# Altium footprint library 5-C-THD.PcbLib: 166 footprints (part 10 of 11)
Each footprint in its own frame and in the unit in brackets; x right, y up, seen from the top. Pads: shape width x height; smd on the part's side, far side on the other; paste and mask are expansions set on the pad; w line width, h text height; cw(c..) or ccw(c..) is an arc to the next point about the centre after c.
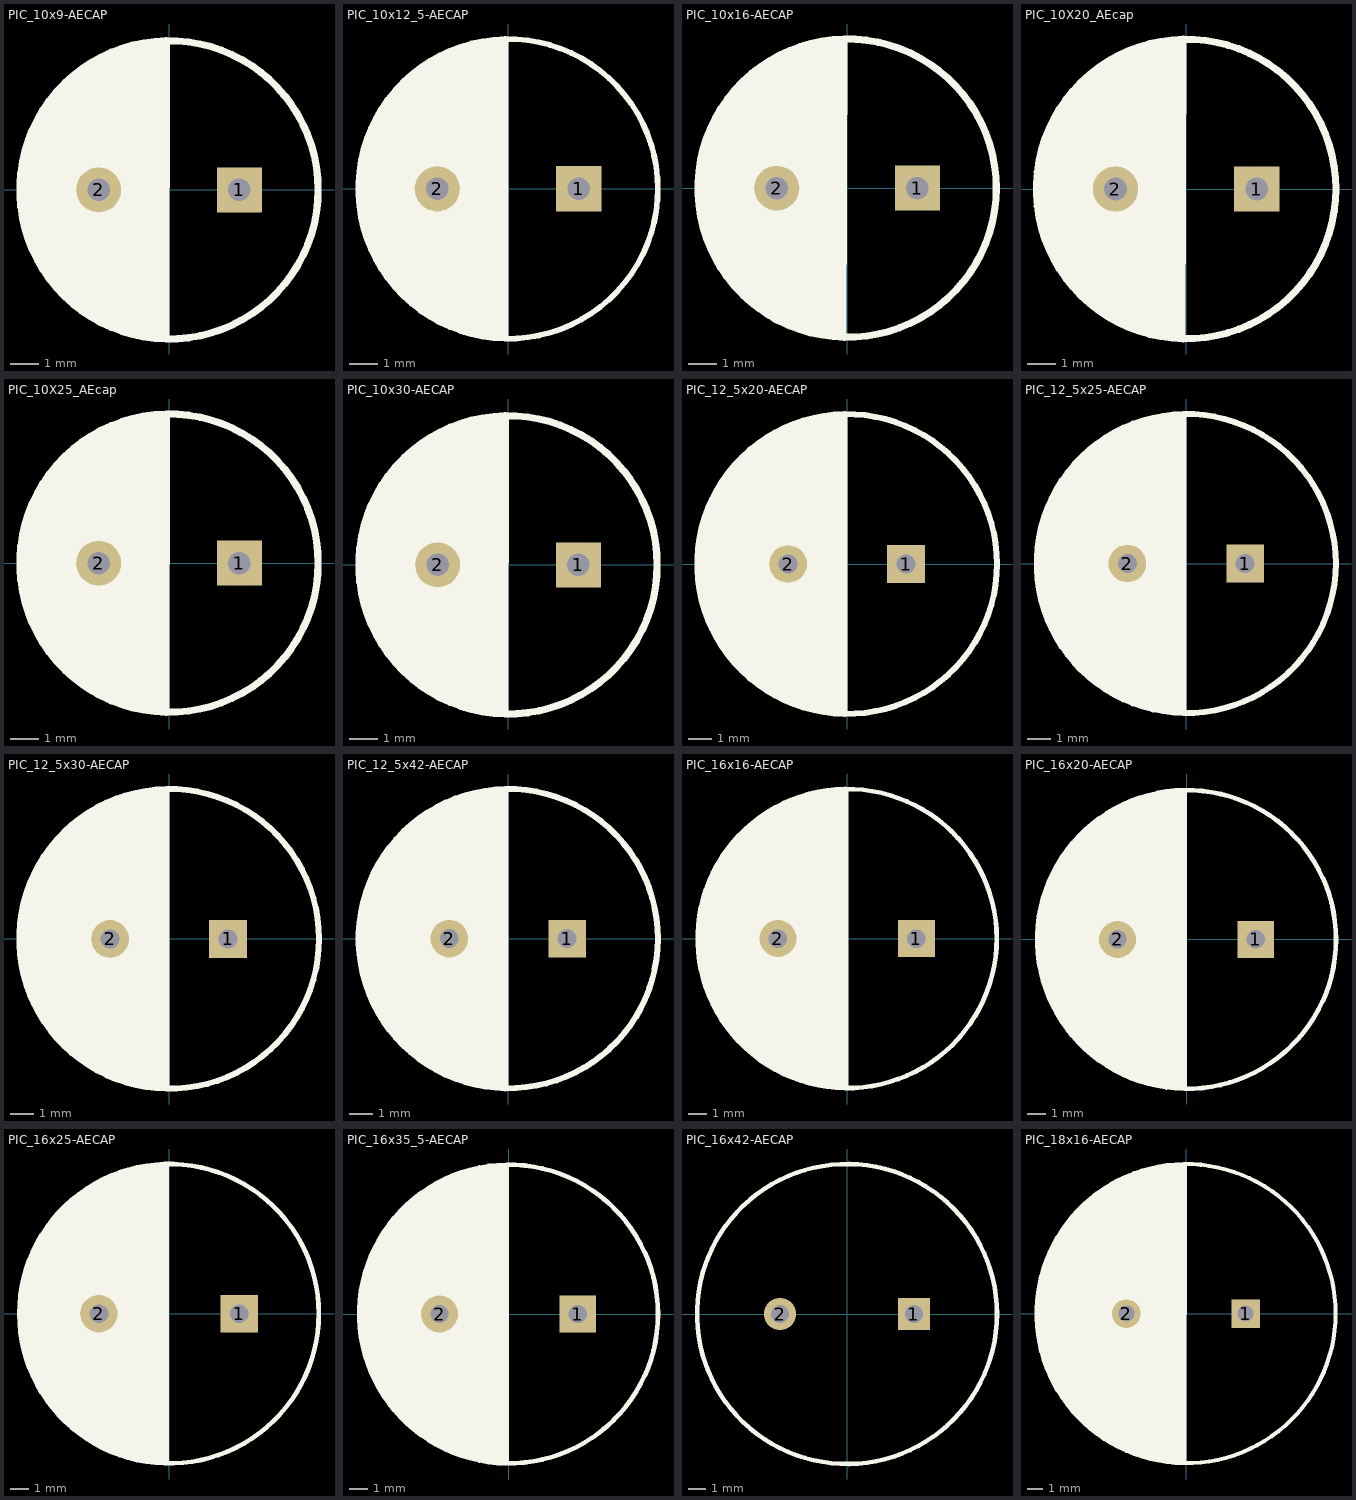
[diagram p9: the footprints below, top view; thin cyan lines are the x and y axes]

## PIC_10x9-AECAP [mm]
height 45
pads (2):
  rect 1.6x1.6 hole 0.8 mask+0.051: 1(2.5,0)
  round 1.6 hole 0.8 mask+0.051: 2(-2.5,0)
Top Overlay:
  circle w0.254: c0,0 r5.3
  region: 0,-5.258 -1.575,-5.08 -2.565,-4.674 -3.607,-3.886 -4.369,-3.073 -5.004,-1.803 -5.283,-0.432 -5.258,0.787 -4.978,1.803 -4.343,3.124 -3.531,3.962 -2.616,4.623 -1.676,5.055 -0.584,5.334 0.025,5.359
3D body "pic_10x9-aecap.stp": height 9, standoff -2.26, extent -5.01,-5.01 5,4.99
3D body "1_6-1_6-0_6-1_8.stp": height -0.95, standoff -2.75, extent -3.3,-0.81 -1.7,0.79
3D body "1_6-1_6-0_6-1_8.stp": height -0.95, standoff -2.75, extent 1.74,-0.81 3.34,0.79

## PIC_10x12_5-AECAP [mm]
height 45
pads (2):
  rect 1.6x1.6 hole 0.8 mask+0.051: 1(2.5,0)
  round 1.6 hole 0.8 mask+0.051: 2(-2.5,0)
Top Overlay:
  circle w0.2: c0,0 r5.3
  region: 0,-5.29 0,5.25 0.03,5.28 -1.07,5.22 -2.1,4.88 -2.99,4.35 -3.99,3.61 -4.61,2.65 -5.05,1.67 -5.26,0.69 -5.29,-0.86 -4.85,-2.27 -3.97,-3.51 -2.85,-4.5 -1.84,-4.99 -0.6,-5.28 -0.04,-5.31
3D body "pic_10x12_5-aecap.stp": height 12.5, standoff -2.25, extent -5.003,-5.01 5,4.99

## PIC_10x16-AECAP [mm]
height 45
pads (2):
  rect 1.6x1.6 hole 0.8 mask+0.051: 1(2.5,0)
  round 1.6 hole 0.8 mask+0.051: 2(-2.5,0)
Top Overlay:
  circle w0.254: c0,0 r5.3
  region: -0.025,-5.359 -1.6,-5.182 -2.591,-4.775 -3.632,-3.988 -4.394,-3.175 -5.029,-1.905 -5.309,-0.533 -5.283,0.686 -5.004,1.702 -4.369,3.023 -3.556,3.861 -2.642,4.521 -1.702,4.953 -0.61,5.232 0,5.258
3D body "pic_10x16-accap.stp": height 16, standoff -2.25, extent -4.973,-5.02 5.03,4.98

## PIC_10X20_AEcap [mm]
height 45
pads (2):
  rect 1.6x1.6 hole 0.8 mask+0.051: 1(2.5,0)
  round 1.6 hole 0.8 mask+0.051: 2(-2.5,0)
Top Overlay:
  circle w0.254: c0,0 r5.3
  region: -0.025,-5.309 -1.6,-5.131 -2.591,-4.724 -3.632,-3.937 -4.394,-3.124 -5.029,-1.854 -5.309,-0.483 -5.283,0.737 -5.004,1.753 -4.369,3.073 -3.556,3.912 -2.642,4.572 -1.702,5.004 -0.61,5.283 0,5.309
3D body "pic_10x16-accap.stp": height 16, standoff -2.25, extent -4.993,-4.99 5.01,5.01

## PIC_10X25_AEcap [mm]
height 45
pads (2):
  rect 1.6x1.6 hole 0.8 mask+0.051: 1(2.5,0)
  round 1.6 hole 0.8 mask+0.051: 2(-2.5,0)
Top Overlay:
  circle w0.254: c0,0 r5.3
  region: 0,-5.359 -1.575,-5.182 -2.565,-4.775 -3.607,-3.988 -4.369,-3.175 -5.004,-1.905 -5.283,-0.533 -5.258,0.686 -4.978,1.702 -4.343,3.023 -3.531,3.861 -2.616,4.521 -1.676,4.953 -0.584,5.232 0.025,5.258
3D body "pic_10x25-aecap.stp": height 25, standoff -2.37, extent -5.01,-5.01 5,4.99

## PIC_10x30-AECAP [mm]
height 45
pads (2):
  rect 1.6x1.6 hole 0.8 mask+0.051: 1(2.5,0)
  round 1.6 hole 0.8 mask+0.051: 2(-2.5,0)
Top Overlay:
  circle w0.254: c0,0 r5.3
  region: 0,-5.258 -1.575,-5.08 -2.565,-4.674 -3.607,-3.886 -4.369,-3.073 -5.004,-1.803 -5.283,-0.432 -5.258,0.787 -4.978,1.803 -4.343,3.124 -3.531,3.962 -2.616,4.623 -1.676,5.055 -0.584,5.334 0.025,5.359
3D body "pic_10x30-aecap.stp": height 30, standoff -2.18, extent -5,-5.01 5.01,4.99

## PIC_12_5x20-AECAP [mm]
height 45
pads (2):
  rect 1.6x1.6 hole 0.8 mask+0.051: 1(2.5,0)
  round 1.6 hole 0.8 mask+0.051: 2(-2.5,0)
Top Overlay:
  circle w0.254: c0,0 r6.35
  region: 0.01,-6.34 0.01,6.31 -0.03,6.31 -1.52,6.18 -2.8,5.72 -4.18,4.75 -5.09,3.75 -5.78,2.7 -6.18,1.44 -6.36,-0.15 -6.16,-1.48 -5.78,-2.67 -5.13,-3.74 -4.16,-4.88 -2.94,-5.65 -1.69,-6.13 -0.36,-6.34
3D body "PIC_12_5x20-AECAP.stp": height 20, standoff -2.21, extent -6.261,-6.24 6.25,6.26

## PIC_12_5x25-AECAP [mm]
height 45
pads (2):
  rect 1.6x1.6 hole 0.8 mask+0.051: 1(2.5,0)
  round 1.6 hole 0.8 mask+0.051: 2(-2.5,0)
Top Overlay:
  circle w0.254: c0,0 r6.35
  region: 0,-6.39 0,6.26 -0.04,6.26 -1.53,6.13 -2.81,5.67 -4.19,4.7 -5.1,3.7 -5.79,2.65 -6.19,1.39 -6.37,-0.2 -6.17,-1.53 -5.79,-2.72 -5.14,-3.79 -4.17,-4.93 -2.95,-5.7 -1.7,-6.18 -0.37,-6.39
3D body "pic_10x25-aecap.stp": height 25, standoff -2.37, extent -5.01,-5.02 5,4.98

## PIC_12_5x30-AECAP [mm]
height 45
pads (2):
  rect 1.6x1.6 hole 0.8 mask+0.051: 1(2.5,0)
  round 1.6 hole 0.8 mask+0.051: 2(-2.5,0)
Top Overlay:
  circle w0.254: c0,0 r6.35
  region: 0.01,-6.36 0.01,6.29 -0.03,6.29 -1.52,6.16 -2.8,5.7 -4.18,4.73 -5.09,3.73 -5.78,2.68 -6.18,1.42 -6.36,-0.17 -6.16,-1.5 -5.78,-2.69 -5.13,-3.76 -4.16,-4.9 -2.94,-5.67 -1.69,-6.15 -0.36,-6.36
3D body "pic_12_5x30-aecap.stp": height 30, standoff -2.11, extent -6.24,-6.24 6.26,6.26

## PIC_12_5x42-AECAP [mm]
height 45
pads (2):
  rect 1.6x1.6 hole 0.8 mask+0.051: 1(2.5,0)
  round 1.6 hole 0.8 mask+0.051: 2(-2.5,0)
Top Overlay:
  circle w0.254: c0,0 r6.35
  region: 0,-6.38 0,6.27 -0.04,6.27 -1.53,6.14 -2.81,5.68 -4.19,4.71 -5.1,3.71 -5.79,2.66 -6.19,1.4 -6.37,-0.19 -6.17,-1.52 -5.79,-2.71 -5.14,-3.78 -4.17,-4.92 -2.95,-5.69 -1.7,-6.17 -0.37,-6.38
3D body "pic_12_5x42-aecap.stp": height 42, standoff -2.02, extent -6.267,-6.31 6.248,6.19

## PIC_16x16-AECAP [mm]
height 45
pads (2):
  rect 2x2 hole 1 mask+0.051: 1(3.75,0)
  round 2 hole 1 mask+0.051: 2(-3.75,0)
Top Overlay:
  circle w0.254: c0,0 r8.1
  region: 0.06,-8.07 0.06,8.1 -0.18,8.1 -1.76,7.92 -3.25,7.44 -4.55,6.69 -5.54,5.89 -6.71,4.59 -7.38,3.41 -7.88,2.03 -8.04,0.88 -8.12,-0.4 -7.86,-2.26 -7.22,-3.78 -6.34,-5.09 -5.22,-6.26 -3.99,-7.06 -2.85,-7.67 -1.06,-8.07 0.08,-8.15
3D body "pic_16x16-aecap.stp": height 16, standoff -1.9, extent -8.025,-8.04 7.99,7.96

## PIC_16x20-AECAP [mm]
height 45
pads (2):
  rect 2x2 hole 1 mask+0.051: 1(3.75,0)
  round 2 hole 1 mask+0.051: 2(-3.75,0)
Top Overlay:
  circle w0.254: c0,0 r8.1
  region: 0.009,-8.019 0.009,8.151 -0.231,8.151 -1.811,7.971 -3.301,7.491 -4.601,6.741 -5.591,5.941 -6.761,4.641 -7.431,3.461 -7.931,2.081 -8.091,0.931 -8.171,-0.349 -7.911,-2.209 -7.271,-3.729 -6.391,-5.039 -5.271,-6.209 -4.041,-7.009 -2.901,-7.619 -1.111,-8.019 0.029,-8.099
3D body "pic_16x20-aecap.stp": height 20, standoff -1.92, extent -8.039,-8.02 7.97,7.98

## PIC_16x25-AECAP [mm]
height 45
pads (2):
  rect 2x2 hole 1 mask+0.051: 1(3.75,0)
  round 2 hole 1 mask+0.051: 2(-3.75,0)
Top Overlay:
  circle w0.254: c0,0 r8
  region: -0.02,-8 -0.02,8 -0.75,7.96 -2.51,7.58 -4.08,6.84 -5.41,5.92 -6.53,4.68 -7.32,3.16 -7.83,1.74 -8.01,0.14 -7.98,-0.93 -7.63,-2.33 -6.81,-4.32 -5.48,-5.89 -3.92,-6.98 -2.02,-7.76 -0.05,-8.03
3D body "pic_16x25-aecap.stp": height 25, standoff -1.85, extent -7.999,-8.02 8.01,7.98

## PIC_16x35_5-AECAP [mm]
height 45
pads (2):
  rect 2x2 hole 1 mask+0.051: 1(3.75,0)
  round 2 hole 1 mask+0.051: 2(-3.75,0)
Top Overlay:
  circle w0.254: c0,0 r8.1
  region: 0.009,-8.045 0.009,8.125 -0.231,8.125 -1.811,7.945 -3.301,7.465 -4.601,6.715 -5.591,5.915 -6.761,4.615 -7.431,3.435 -7.931,2.055 -8.091,0.905 -8.171,-0.375 -7.911,-2.235 -7.271,-3.755 -6.391,-5.065 -5.271,-6.235 -4.041,-7.035 -2.901,-7.645 -1.111,-8.045 0.029,-8.125
3D body "pic_16x35_5-aecap.stp": height 35.5, standoff -2.07, extent -8.01,-8.02 8.01,7.98

## PIC_16x42-AECAP [mm]
height 45
pads (2):
  rect 1.8x1.8 hole 1 mask+0.051: 1(3.75,0)
  round 1.8 hole 1 mask+0.051: 2(-3.75,0)
Top Overlay:
  circle w0.254: c0,0 r8.4
3D body "pic_16x42-aecap.stp": height 42, standoff -1.85, extent -7.97,-8.06 8.05,7.94

## PIC_18x16-AECAP [mm]
height 45
pads (2):
  rect 1.8x1.8 hole 1 mask+0.051: 1(3.75,0)
  round 1.8 hole 1 mask+0.051: 2(-3.75,0)
Top Overlay:
  circle w0.254: c0,0 r9.4
  region: 0.025,-9.449 -2.108,-9.169 -4.013,-8.585 -5.232,-7.823 -6.629,-6.807 -7.569,-5.563 -8.433,-4.013 -9.042,-2.667 -9.373,-0.61 -9.322,1.473 -8.712,3.505 -7.772,5.436 -6.452,6.807 -5.055,8.026 -3.531,8.738 -2.286,9.169 -0.737,9.322 0.051,9.322
3D body "pic_18x16-aecap.stp": height 16, standoff -2.03, extent -9.033,-8.96 8.992,9.04